# Altium footprint library Project_Oshinoko.PcbLib: 211 footprints (part 9 of 14)
Each footprint in its own frame and in the unit in brackets; x right, y up, seen from the top. Pads: shape width x height; smd on the part's side, far side on the other; paste and mask are expansions set on the pad; w line width, h text height; cw(c..) or ccw(c..) is an arc to the next point about the centre after c.
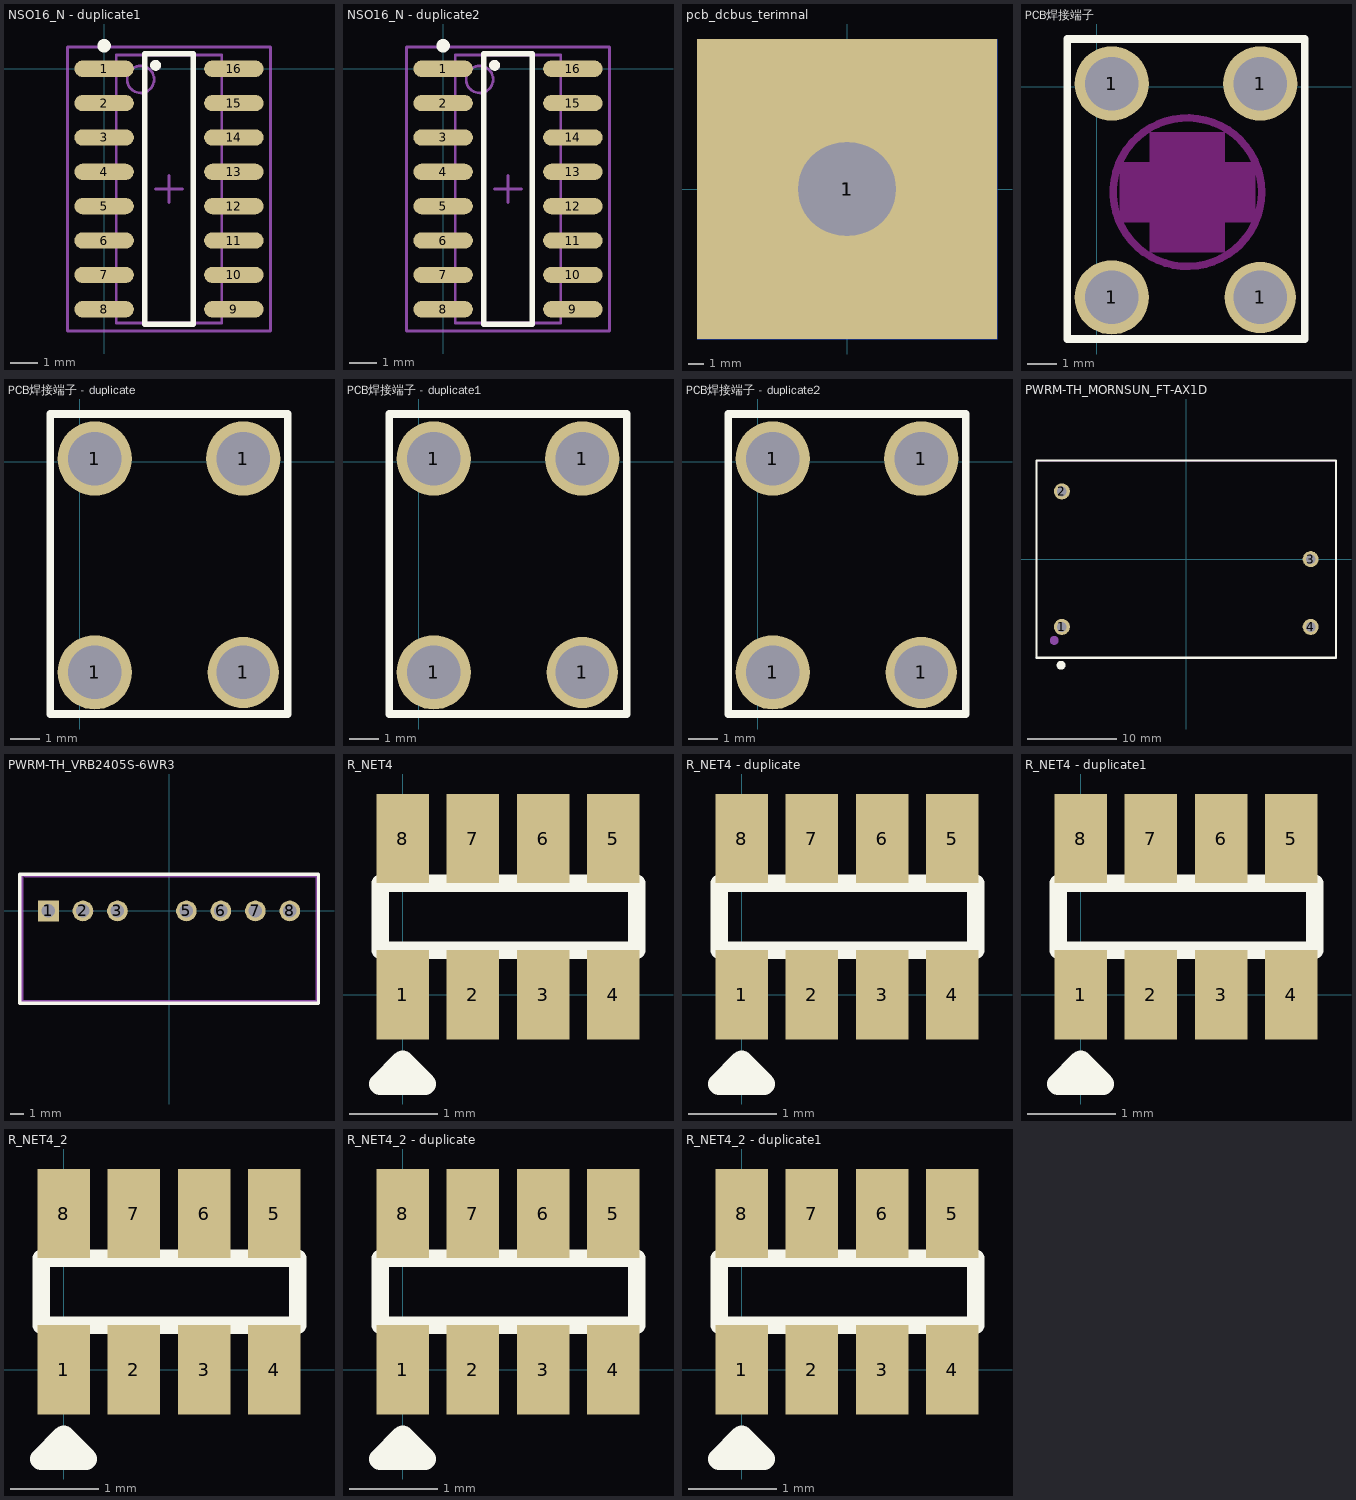
[diagram p8: the footprints below, top view; thin cyan lines are the x and y axes]

## NSO16_N - duplicate1 [mm]
pads (16):
  oval 2.2x0.6 smd: 1(0,0) 2(0,-1.27) 3(0,-2.54) 4(0,-3.81) 5(0,-5.08) 6(0,-6.35) 7(0,-7.62) 8(0,-8.89) 9(4.8,-8.89) 10(4.8,-7.62) 11(4.8,-6.35) 12(4.8,-5.08) 13(4.8,-3.81) 14(4.8,-2.54) 15(4.8,-1.27) 16(4.8,0)
Top Overlay:
  circle w0.25: c1.905,0.127 r0.076
  circle w0.25: c0,0.85 r0.125
  lines w0.2: 1.5,-9.445 3.3,-9.445 3.3,0.555 1.5,0.555 1.5,-9.445
Mechanical 13:
  circle w0.1: c1.35,-0.395 r0.5
  lines w0.1: 0.45,-9.395 4.35,-9.395 4.35,0.505 0.45,0.505 0.45,-9.395
Mechanical 15:
  lines w0.1: 1.9,-4.445 2.9,-4.445 ; 2.4,-4.945 2.4,-3.945 ; -1.35,-9.695 6.15,-9.695 6.15,0.805 -1.35,0.805 -1.35,-9.695

## NSO16_N - duplicate2 [mm]
pads (16):
  oval 2.2x0.6 smd: 1(0,0) 2(0,-1.27) 3(0,-2.54) 4(0,-3.81) 5(0,-5.08) 6(0,-6.35) 7(0,-7.62) 8(0,-8.89) 9(4.8,-8.89) 10(4.8,-7.62) 11(4.8,-6.35) 12(4.8,-5.08) 13(4.8,-3.81) 14(4.8,-2.54) 15(4.8,-1.27) 16(4.8,0)
Top Overlay:
  circle w0.25: c1.905,0.127 r0.076
  circle w0.25: c0,0.85 r0.125
  lines w0.2: 1.5,-9.445 3.3,-9.445 3.3,0.555 1.5,0.555 1.5,-9.445
Mechanical 13:
  circle w0.1: c1.35,-0.395 r0.5
  lines w0.1: 0.45,-9.395 4.35,-9.395 4.35,0.505 0.45,0.505 0.45,-9.395
Mechanical 15:
  lines w0.1: 1.9,-4.445 2.9,-4.445 ; 2.4,-4.945 2.4,-3.945 ; -1.35,-9.695 6.15,-9.695 6.15,0.805 -1.35,0.805 -1.35,-9.695

## pcb_dcbus_terimnal [mm]
pads (3):
  round 9 hole 6.2 slot 6.5 at 0 deg: 1(0,0)
  rect 20x20 smd: 1(0,0)
  rect 20x20 smd far side: 1(0,0)

## PCBComponent_1 [mil]

## PCB焊接端子 [mm]
pads (4):
  round 2.5 hole 1.8: 1(0.5,-7.1) 1(0.5,0.1) 1(5.5,0.1)
  round 2.4 hole 1.8: 1(5.5,-7.1)
Top Overlay:
  lines w0.254: -1,-8.5 7,-8.5 7,1.6 -1,1.6 -1,-8.5
Keep-Out Layer:
  circle w0.254: c3.048,-3.556 r2.5
  rectangle: 0.762,-4.572 5.334,-2.54
  rectangle: 1.778,-5.588 4.318,-1.524
  region: 2.54,-1.524

## PCB焊接端子 - duplicate [mm]
pads (4):
  round 2.5 hole 1.8: 1(0.5,-7.1) 1(0.5,0.1) 1(5.5,0.1)
  round 2.4 hole 1.8: 1(5.5,-7.1)
Top Overlay:
  lines w0.254: -1,-8.5 7,-8.5 7,1.6 -1,1.6 -1,-8.5

## PCB焊接端子 - duplicate1 [mm]
pads (4):
  round 2.5 hole 1.8: 1(0.5,-7.1) 1(0.5,0.1) 1(5.5,0.1)
  round 2.4 hole 1.8: 1(5.5,-7.1)
Top Overlay:
  lines w0.254: -1,-8.5 7,-8.5 7,1.6 -1,1.6 -1,-8.5

## PCB焊接端子 - duplicate2 [mm]
pads (4):
  round 2.5 hole 1.8: 1(0.5,-7.1) 1(0.5,0.1) 1(5.5,0.1)
  round 2.4 hole 1.8: 1(5.5,-7.1)
Top Overlay:
  lines w0.254: -1,-8.5 -1,1.6 7,1.6 7,-8.5 -1,-8.5

## PWRM-TH_MORNSUN_FT-AX1D [mm]
pads (4):
  round 1.8 hole 1.1 paste+0 mask+0.05: 1(-14,-7.62) 2(-14,7.62) 3(14,0) 4(14,-7.62)
Top Overlay:
  circle w0.5: c-14.097,-11.938 r0.25
  lines w0.254: -16.85,-11.1 -16.85,11.1 16.85,11.1 16.85,-11.1 -16.85,-11.1
Mechanical 6:
  circle w0.5: c-14.859,-9.144 r0.25
Mechanical 15:
  region: -13.7,-7.62 -13.7,-7.56 -13.746,-7.45 -13.83,-7.366 -13.94,-7.32 -14.06,-7.32 -14.17,-7.366 -14.254,-7.45 -14.3,-7.56 -14.3,-7.62 -14.3,-7.68 -14.254,-7.79 -14.17,-7.874 -14.06,-7.92 -13.94,-7.92 -13.83,-7.874 -13.746,-7.79 -13.7,-7.68 -13.7,-7.62
  region: -13.7,7.62 -13.7,7.68 -13.746,7.79 -13.83,7.874 -13.94,7.92 -14.06,7.92 -14.17,7.874 -14.254,7.79 -14.3,7.68 -14.3,7.62 -14.3,7.56 -14.254,7.45 -14.17,7.366 -14.06,7.32 -13.94,7.32 -13.83,7.366 -13.746,7.45 -13.7,7.56 -13.7,7.62
  region: 14.3,0 14.3,0.06 14.254,0.17 14.17,0.254 14.06,0.3 13.94,0.3 13.83,0.254 13.746,0.17 13.7,0.06 13.7,0 13.7,-0.06 13.746,-0.17 13.83,-0.254 13.94,-0.3 14.06,-0.3 14.17,-0.254 14.254,-0.17 14.3,-0.06 14.3,0
  region: 14.3,-7.62 14.3,-7.56 14.254,-7.45 14.17,-7.366 14.06,-7.32 13.94,-7.32 13.83,-7.366 13.746,-7.45 13.7,-7.56 13.7,-7.62 13.7,-7.68 13.746,-7.79 13.83,-7.874 13.94,-7.92 14.06,-7.92 14.17,-7.874 14.254,-7.79 14.3,-7.68 14.3,-7.62
  region: -16.79,-11.1 -16.79,-11.075 -16.825,-11.04 -16.875,-11.04 -16.91,-11.075 -16.91,-11.1 -16.91,-11.125 -16.875,-11.16 -16.825,-11.16 -16.79,-11.125 -16.79,-11.1
  lines w0.051: -16.85,-11.1 16.85,-11.1 16.85,11.1 -16.85,11.1 -16.85,-11.1

## PWRM-TH_VRB2405S-6WR3 [mil]
pads (7):
  rect 60x60 hole 39.37: 1(-350,0)
  round 60 hole 39.37: 2(-250,0) 3(-150,0) 5(50,0) 6(150,0) 7(250,0) 8(350,0)
Top Overlay:
  lines w10: -433.15,-267.72 433.07,-267.72 433.07,106.34 -433.07,106.34 -433.07,-267.72
Mechanical 6:
  region: -423.74,102.36 -423.74,-258.78 424.53,-258.78 424.53,97.36 -416.93,97.36 -419,97.36 -421.93,100.29 -421.93,104.43 -419,107.36 -416.93,107.36 429.53,107.36 430.52,107.36 432.36,106.6 433.76,105.19 434.53,103.36 434.53,102.36 434.53,-263.78 434.53,-264.77 433.76,-266.61 432.36,-268.02 430.52,-268.78 429.53,-268.78 -428.74,-268.78 -429.73,-268.78 -431.57,-268.02 -432.98,-266.61 -433.74,-264.77 -433.74,-263.78 -433.74,102.36 -433.74,104.43 -430.81,107.36 -426.67,107.36 -423.74,104.43 -423.74,102.36
Mechanical 15:
  region: 336.22,5.91 363.78,5.91 363.78,-5.91 336.22,-5.91
  region: 236.22,5.91 263.78,5.91 263.78,-5.91 236.22,-5.91
  region: 136.22,5.91 163.78,5.91 163.78,-5.91 136.22,-5.91
  region: 36.22,5.91 63.78,5.91 63.78,-5.91 36.22,-5.91
  region: -163.78,5.91 -136.22,5.91 -136.22,-5.91 -163.78,-5.91
  region: -263.78,5.91 -236.22,5.91 -236.22,-5.91 -263.78,-5.91
  region: -363.78,5.91 -336.22,5.91 -336.22,-5.91 -363.78,-5.91
  region: -430.71,-267.72 -430.71,-266.74 -432.09,-265.35 -434.05,-265.35 -435.43,-266.74 -435.43,-267.72 -435.43,-268.69 -434.05,-270.08 -432.09,-270.08 -430.71,-268.69 -430.71,-267.72
  lines w2: -433.07,-267.72 433.07,-267.72 433.07,106.3 -433.07,106.3 -433.07,-267.72

## R_NET4 [mm]
pads (8):
  rect 0.6x1.016 smd: 1(0,0) 2(0.8,0) 3(1.6,0) 4(2.4,0) 5(2.4,1.778) 6(1.6,1.778) 7(0.8,1.778) 8(0,1.778)
Top Overlay:
  lines w0.2: -0.254,0.508 -0.254,1.27 2.667,1.27 2.667,0.508 -0.254,0.508
  lines w0.254: -0.254,-1.016 0.254,-1.016 0,-0.762 -0.254,-1.016

## R_NET4 - duplicate [mm]
pads (8):
  rect 0.6x1.016 smd: 1(0,0) 2(0.8,0) 3(1.6,0) 4(2.4,0) 5(2.4,1.778) 6(1.6,1.778) 7(0.8,1.778) 8(0,1.778)
Top Overlay:
  lines w0.2: -0.254,0.508 2.667,0.508 2.667,1.27 -0.254,1.27 -0.254,0.508
  lines w0.254: -0.254,-1.016 0,-0.762 0.254,-1.016 -0.254,-1.016

## R_NET4 - duplicate1 [mm]
pads (8):
  rect 0.6x1.016 smd: 1(0,0) 2(0.8,0) 3(1.6,0) 4(2.4,0) 5(2.4,1.778) 6(1.6,1.778) 7(0.8,1.778) 8(0,1.778)
Top Overlay:
  lines w0.2: -0.254,0.508 2.667,0.508 2.667,1.27 -0.254,1.27 -0.254,0.508
  lines w0.254: -0.254,-1.016 0,-0.762 0.254,-1.016 -0.254,-1.016

## R_NET4_2 [mm]
pads (8):
  rect 0.6x1.016 smd: 1(0,0) 2(0.8,0) 3(1.6,0) 4(2.4,0) 5(2.4,1.778) 6(1.6,1.778) 7(0.8,1.778) 8(0,1.778)
Top Overlay:
  lines w0.2: -0.254,0.508 2.667,0.508 2.667,1.27 -0.254,1.27 -0.254,0.508
  lines w0.254: -0.254,-1.016 0,-0.762 0.254,-1.016 -0.254,-1.016

## R_NET4_2 - duplicate [mm]
pads (8):
  rect 0.6x1.016 smd: 1(0,0) 2(0.8,0) 3(1.6,0) 4(2.4,0) 5(2.4,1.778) 6(1.6,1.778) 7(0.8,1.778) 8(0,1.778)
Top Overlay:
  lines w0.2: -0.254,0.508 2.667,0.508 2.667,1.27 -0.254,1.27 -0.254,0.508
  lines w0.254: -0.254,-1.016 0,-0.762 0.254,-1.016 -0.254,-1.016

## R_NET4_2 - duplicate1 [mm]
pads (8):
  rect 0.6x1.016 smd: 1(0,0) 2(0.8,0) 3(1.6,0) 4(2.4,0) 5(2.4,1.778) 6(1.6,1.778) 7(0.8,1.778) 8(0,1.778)
Top Overlay:
  lines w0.2: -0.254,0.508 2.667,0.508 2.667,1.27 -0.254,1.27 -0.254,0.508
  lines w0.254: -0.254,-1.016 0,-0.762 0.254,-1.016 -0.254,-1.016